# Altium footprint library PassiveComponents.PcbLib: 48 footprints (part 1 of 3)
Each footprint in its own frame and in the unit in brackets; x right, y up, seen from the top. Pads: shape width x height; smd on the part's side, far side on the other; paste and mask are expansions set on the pad; w line width, h text height; cw(c..) or ccw(c..) is an arc to the next point about the centre after c.
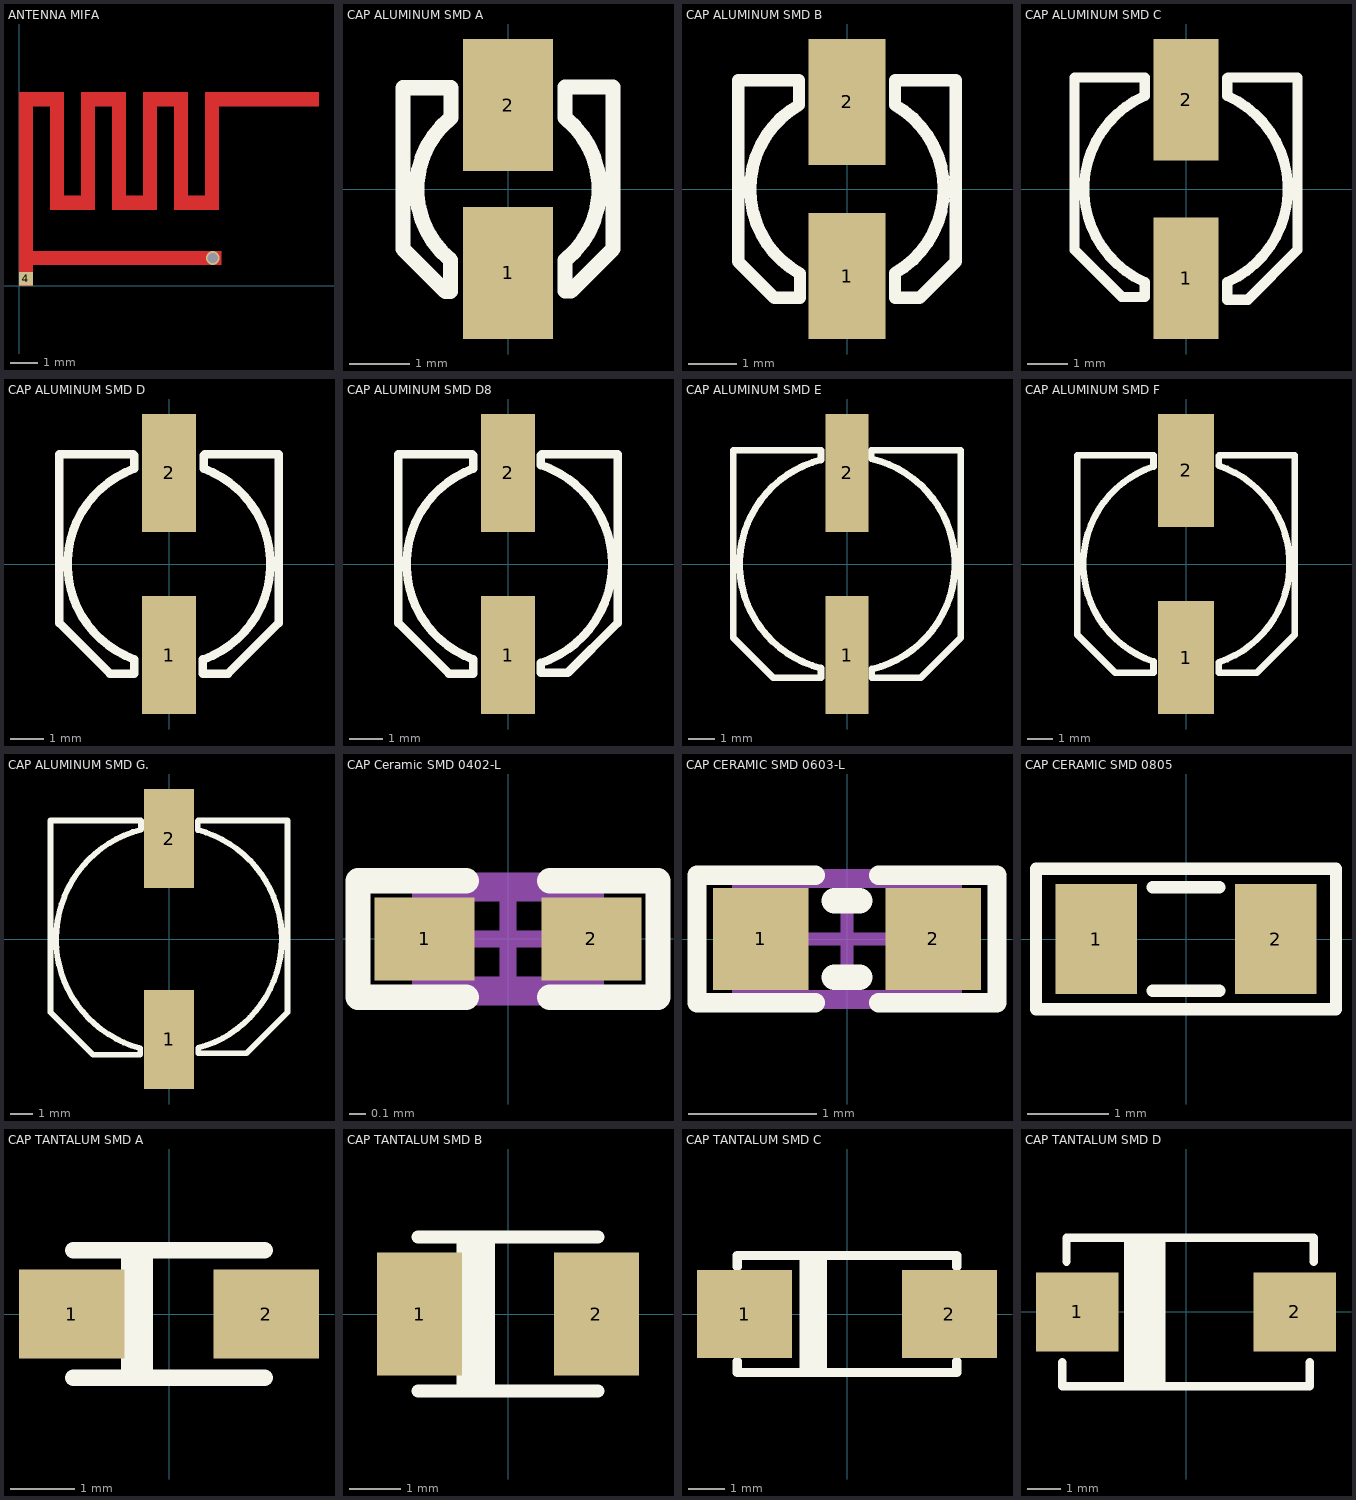
[diagram p0: the footprints below, top view; thin cyan lines are the x and y axes]

## ANTENNA MIFA [mil]
pads (1):
  rect 20x20 smd: 4(10,10)
via 281,40 diameter 20 hole 15
Top Layer:
  region: 0,0 0,280 65,280 65,130 90,130 90,280 155,280 155,130 180,130 180,280 245,280 245,130 270,130 270,280 435,280 435,260 290,260 290,110 225,110 225,260 200,260 200,110 135,110 135,260 110,260 110,110 45,110 45,260 20,260 20,50 293,50 293,30 20,30 20,0

## CAP ALUMINUM SMD A [mm] "SMT Aluminum Electrolytic Capacitors, Dimensions 3x5.8(DxL)"
pads (2):
  rect 1.5x2.2 smd: 1(0,-1.4) 2(0,1.4)
Top Overlay:
  lines w0.254: -0.96,-1.187 -0.96,-1.71 -1.04,-1.71 -1.75,-1 -1.75,1.689 -0.95,1.689 -0.95,1.187 ccw(c0,0) -0.956,-1.182 ; 0.95,-1.7 0.95,-1.187 ccw(c0,0) 0.95,1.187 0.95,1.7 1.75,1.7 1.75,-1 1.05,-1.7 0.95,-1.7
3D body "User Library-ALU-A.STEP": height 5.4, standoff 0, extent -1.65,-1.81 1.65,1.79

## CAP ALUMINUM SMD B [mm] "SMT Aluminum Electrolytic Capacitors, Dimensions 4x5.8(DxL)"
pads (2):
  rect 1.6x2.6 smd: 1(0,-1.8) 2(0,1.8)
Top Overlay:
  lines w0.254: -2.25,-1.5 -1.5,-2.25 -0.971,-2.25 -0.971,-1.748 cw(c0,0) -0.992,1.736 -0.992,2.242 -1,2.25 -2.25,2.25 -2.25,-1.5 ; 0.992,-2.242 0.992,-1.736 ccw(c0,0) 0.992,1.736 0.992,2.242 1,2.25 2.25,2.25 2.25,-1.5 1.5,-2.25 1,-2.25 0.992,-2.242
3D body "User Library-ALU-B.STEP": height 5.4, standoff 0, extent -2.17,-2.31 2.13,2.29

## CAP ALUMINUM SMD C [mm] "SMT Aluminum Electrolytic Capacitors, Dimensions 5x5.8(DxL)"
pads (2):
  rect 1.6x3 smd: 1(0,-2.2) 2(0,2.2)
Top Overlay:
  lines w0.254: -2.75,-1.5 -1.587,-2.663 -1.02,-2.663 -1.02,-2.296 cw(c0,0) -1.02,2.296 -1.02,2.73 -1.02,2.75 -2.75,2.75 -2.75,-1.5 ; 1.02,-2.73 1.52,-2.73 2.75,-1.5 2.75,2.75 1.041,2.75 1.02,2.73 1.02,2.296 cw(c0,0) 1.02,-2.296 1.02,-2.73
3D body "User Library-ALU-C.STEP": height 5.41, standoff 0, extent -2.65,-2.94 2.65,2.96

## CAP ALUMINUM SMD D [mm] "SMT Aluminum Electrolytic Capacitors, Dimensions 6.3x5.8(DxL)"
pads (2):
  rect 1.6x3.5 smd: 1(0,-2.7) 2(0,2.7)
Top Overlay:
  lines w0.254: 1,-2.829 1,-2.986 1,-3.25 1.75,-3.25 3.25,-1.75 3.25,3.25 1.058,3.25 1.029,3.221 1.029,2.829 cw(c0,0) 1.029,-2.829 ; -3.25,-1.75 -3.25,3.25 -1.058,3.25 -1.029,3.221 -1.029,2.829 ccw(c0,0) -1.029,-2.829 -1.029,-3.25 -1.75,-3.25 -3.25,-1.75
3D body "User Library-ALU-D.STEP": height -0.4, standoff -5.8, extent -3.3,-3.5 3.3,3.5

## CAP ALUMINUM SMD D8 [mm] "SMT Aluminum Electrolytic Capacitors, Dimensions 6.3x7.7(DxL)"
pads (2):
  rect 1.6x3.5 smd: 1(0,-2.7) 2(0,2.7)
Top Overlay:
  lines w0.254: -3.25,-1.75 -1.75,-3.25 -1.029,-3.25 -1.029,-2.829 cw(c0,0) -1.029,2.829 -1.029,3.221 -1.058,3.25 -3.25,3.25 -3.25,-1.75 ; 0.978,-3.228 0.978,-2.934 ccw(c0,0) 0.978,2.934 0.978,3.228 1,3.25 3.25,3.25 3.25,-1.75 1.772,-3.228 0.978,-3.228
3D body "User Library-ALU-D8.STEP": height 7.7, standoff 0, extent -3.34,-3.52 3.26,3.48

## CAP ALUMINUM SMD E [mm] "SMT Aluminum Electrolytic Capacitors, Dimensions 8x6.2(DxL)"
pads (2):
  rect 1.6x4.4 smd: 1(0,-3.4) 2(0,3.4)
Top Overlay:
  lines w0.254: -4.25,-2.75 -2.75,-4.25 -0.972,-4.25 -0.972,-3.888 cw(c0,0) -0.972,3.888 -0.972,4.25 -4.25,4.25 -4.25,-2.75 ; 0.906,3.928 cw(c0,0) 0.923,-3.924 0.923,-4.25 2.75,-4.25 4.25,-2.75 4.25,4.25 0.906,4.25 0.906,3.928
3D body "User Library-ALU-E.STEP": height 6.2, standoff 0, extent -4.13,-4.51 4.17,4.49

## CAP ALUMINUM SMD F [mm] "SMT Aluminum Electrolytic Capacitors, Dimensions 8x10.2(DxL)"
pads (2):
  rect 2.2x4.4 smd: 1(0,-3.65) 2(0,3.65)
Top Overlay:
  lines w0.254: -4.25,-2.75 -2.75,-4.25 -1.285,-4.25 -1.267,-4.233 -1.267,-3.802 cw(c0,0) -1.267,3.802 -1.267,4.233 -1.285,4.25 -4.25,4.25 -4.25,-2.75 ; 1.277,-4.25 2.75,-4.25 4.25,-2.75 4.25,4.25 1.304,4.25 1.277,4.223 1.277,3.832 cw(c0,0) 1.277,-3.832 1.277,-4.223 1.277,-4.25
3D body "User Library-ALU-F.STEP": height 10.2, standoff 0, extent -4.12,-4.98 4.18,4.92

## CAP ALUMINUM SMD G. [mm] "SMT Aluminum Electrolytic Capacitors, Dimensions 10.2x10.2(DxL)"
pads (2):
  rect 2.2x4.4 smd: 1(0,-4.45) 2(0,4.45)
Top Overlay:
  lines w0.254: -3.369,-5.131 -3.368,-5.132 ; 3.5,-5 3.432,-5.068 ; -3.368,-5.132 -5.25,-3.25 -5.25,5.25 -1.25,5.25 -1.239,5.239 -1.239,4.85 ccw(c0,0) -1.274,-4.841 -1.274,-5.108 -1.298,-5.132 -3.368,-5.132 ; 3.432,-5.068 5.25,-3.25 5.25,5.25 1.295,5.25 1.272,5.228 1.272,4.835 cw(c0,0) 1.292,-4.83 1.292,-5.025 1.292,-5.068 3.432,-5.068
3D body "User Library-ALU-G.STEP": height 10.2, standoff 0, extent -5.17,-5.77 5.13,5.83

## CAP Ceramic SMD 0402-L [mm] "Chip Capacitor, 2-Leads, Body 1.0x0.5mm, IPC High Density"
height 0.4
pads (2):
  rect 0.6x0.5 smd: 1(-0.5,0) 2(0.5,0)
Top Overlay:
  lines w0.152: -0.25,-0.35 -0.9,-0.35 -0.9,0.35 -0.25,0.35 ; 0.25,-0.35 0.9,-0.35 0.9,0.35 0.25,0.35
Mechanical 13:
  lines w0.1: -0.525,-0.275 -0.525,0.275 0.525,0.275 0.525,-0.275 -0.525,-0.275
Mechanical 15:
  lines w0.1: -0.275,0 0.275,0 ; 0,-0.275 0,0.275 ; -0.9,-0.35 0.9,-0.35 0.9,0.35 -0.9,0.35 -0.9,-0.35
3D body "User Library-0402(1005M) Cap.step": height 0.5, standoff -0.01, extent -0.508,-0.254 0.508,0.254

## CAP CERAMIC SMD 0603-L [mm] "Chip Capacitor, 2-Leads, Body 1.6x0.8mm, IPC High Density"
height 0.55
pads (2):
  rect 0.75x0.8 smd: 1(-0.675,0) 2(0.675,0)
Top Overlay:
  lines w0.152: -0.25,-0.5 -1.175,-0.5 -1.175,0.5 -0.25,0.5 ; 0.25,-0.5 1.175,-0.5 1.175,0.5 0.25,0.5
  lines w0.2: -0.1,-0.3 0.1,-0.3 ; -0.1,0.3 0.1,0.3
Mechanical 13:
  lines w0.1: -0.85,-0.45 -0.85,0.45 0.85,0.45 0.85,-0.45 -0.85,-0.45
Mechanical 15:
  lines w0.1: -0.45,0 0.45,0 ; 0,-0.45 0,0.45 ; -1.175,-0.5 1.175,-0.5 1.175,0.5 -1.175,0.5 -1.175,-0.5
3D body "User Library-Chip Capacitor 0603.step": height 0.8, standoff 0, extent -0.8,-0.43 0.8,0.43

## CAP CERAMIC SMD 0805 [mm]
pads (2):
  rect 1x1.35 smd: 1(-1.1,0) 2(1.1,0)
Top Overlay:
  lines w0.152: -0.406,-0.635 0.406,-0.635 ; -0.406,0.635 0.406,0.635 ; -1.84,-0.864 1.84,-0.864 1.84,0.864 -1.84,0.864 -1.84,-0.864
3D body "SW3dPS-smt_resistor_packages.STEP": height 0.61, standoff -0.01, extent -1.01,-0.635 1.01,0.635

## CAP TANTALUM SMD A [mm]
height 1.6
pads (2):
  rect 1.65x1.4 smd: 1(-1.525,0) 2(1.525,0)
Top Overlay:
  rectangle: -0.75,-1 -0.25,1
  lines w0.254: -1.5,-1 1.5,-1 ; -1.5,1 1.5,1
3D body "User Library-CaseA_3216-18.STEP": height 1.6, standoff 0, extent -1.6,-0.8 1.6,0.8

## CAP TANTALUM SMD B [mm]
height 1.9
pads (2):
  rect 1.65x2.4 smd: 1(-1.725,0) 2(1.725,0)
Top Overlay:
  rectangle: -1,-1.5 -0.25,1.5
  lines w0.254: -1.75,-1.5 1.75,-1.5 ; -1.75,1.5 1.75,1.5
3D body "User Library-CaseB_3528-21.STEP": height 1.9, standoff 0, extent -1.75,-1.425 1.75,1.375

## CAP TANTALUM SMD C [mm]
pads (2):
  rect 2.6x2.4 smd: 1(-2.8,0) 2(2.8,0)
Top Overlay:
  rectangle: -1.3,-1.6 -0.55,1.6
  lines w0.254: -3,-1.3 -3,-1.6 3,-1.6 3,-1.3 ; -3,1.3 -3,1.6 3,1.6 3,1.3
3D body "User Library-CaseC_6032-28.STEP": height 2.5, standoff 0, extent -3,-1.6 3,1.6

## CAP TANTALUM SMD D [mm]
pads (2):
  rect 2.5x2.4 smd: 1(-3.3,0) 2(3.3,0)
Top Overlay:
  rectangle: -1.875,-2.375 -0.625,2.25
  lines w0.254: -3.75,-1.524 -3.75,-2.25 3.75,-2.25 3.75,-1.524 ; -3.625,1.524 -3.625,2.25 3.875,2.25 3.875,1.524
3D body "User Library-CaseD_7343-31.STEP": height 2.8, standoff 0, extent -3.63,-2.15 3.67,2.15